# Altium footprint library RODION.PcbLib: 131 footprints (part 2 of 9)
Each footprint in its own frame and in the unit in brackets; x right, y up, seen from the top. Pads: shape width x height; smd on the part's side, far side on the other; paste and mask are expansions set on the pad; w line width, h text height; cw(c..) or ccw(c..) is an arc to the next point about the centre after c.
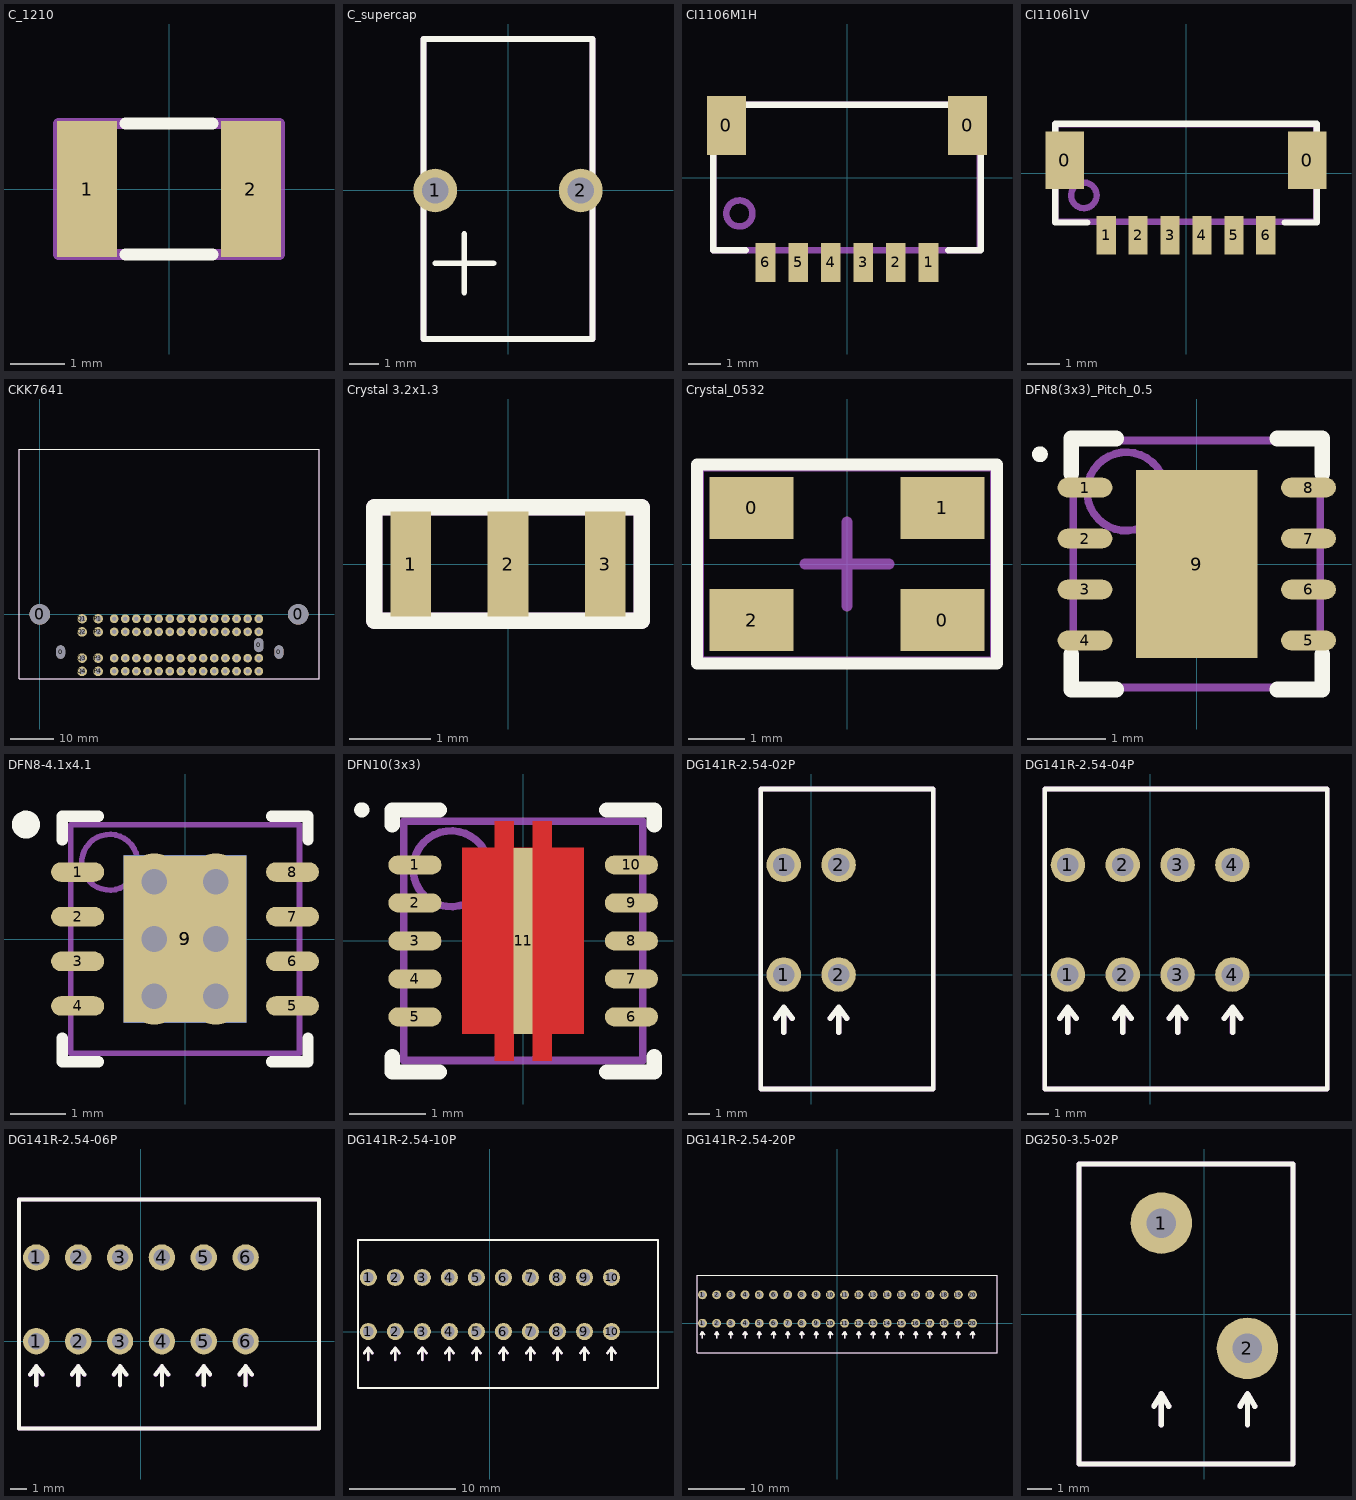
[diagram p1: the footprints below, top view; thin cyan lines are the x and y axes]

## C_1210 [mm] "Chip, Body 3.2x2.5mm, IPC High Density"
height 1.7
pads (2):
  rect 1.1x2.5 smd: 1(-1.5,0) 2(1.5,0)
Top Overlay:
  lines w0.22: -0.8,-1.2 0.8,-1.2 ; -0.8,1.2 0.8,1.2
Top_Assy:
  lines w0.2: -2.025,-1.2 2.025,-1.2 2.025,1.2 -2.025,1.2 -2.025,-1.2
  text ".Designator" at -1.35,-0.525 h1
3D body "CAP1210.stp": height 0.94, standoff 0, extent -1.6,-1.25 1.6,1.25

## C_supercap [mm]
height 11.5
pads (2):
  round 1.5 hole 0.9: 1(-2.5,0) 2(2.5,0)
Top Overlay:
  lines w0.2: -2.5,-2.5 -0.5,-2.5 ; -1.5,-3.5 -1.5,-1.5 ; -2.9,-5.1 2.9,-5.1 2.9,5.2 -2.9,5.2 -2.9,-5.1
Top_Assy:
  lines w0.2: -2.9,-5.1 -2.9,5.2 2.9,5.2 2.9,-5.1 -2.9,-5.1
  text ".Designator" at -1.375,-0.6 h1
3D body "Supercap.STEP": height 10.5, standoff -3, extent -2.75,-4.999 2.75,5

## CI1106M1H [mm] "CI1106M1H - 6 pin SMD connector, 1 mm pitch"
height 2.2
pads (8):
  rect 1.2x1.8 smd: 0(-3.7,1.6) 0(3.7,1.6)
  rect 0.6x1.2 smd: 1(2.5,-2.6) 2(1.5,-2.6) 3(0.5,-2.6) 4(-0.5,-2.6) 5(-1.5,-2.6) 6(-2.5,-2.6)
Top Overlay:
  lines w0.2: -3.1,-2.23 -4.1,-2.23 -4.1,2.23 4.1,2.23 4.1,-2.23 3.1,-2.23
Top_Assy:
  circle w0.2: c-3.3,-1.1 r0.4
  lines w0.2: -4.1,-2.23 -4.1,2.23 4.075,2.23 4.075,-2.23 -4.1,-2.23
  text ".Designator" at -3.5,0.6 h1
3D body "SM06B-SRSS-TB.step": height 2.9, standoff 0, extent -4,-2.8 4,2.15

## CI1106Ì1V [mm] "ÑI1106Ì1V - 6 pin SMD connector, 1 mm pitch"
height 4.25
pads (8):
  rect 1.2x1.8 smd: 0(-3.8,0.4) 0(3.8,0.4)
  rect 0.6x1.2 smd: 1(-2.5,-1.95) 2(-1.5,-1.95) 3(-0.5,-1.95) 4(0.5,-1.95) 5(1.5,-1.95) 6(2.5,-1.95)
Top Overlay:
  lines w0.2: -3.1,-1.55 -4.1,-1.55 -4.1,1.55 4.1,1.55 ; 3.1,-1.55 4.1,-1.55 4.1,1.55 ; 4,1.55 4.1,1.55
Top_Assy:
  circle w0.2: c-3.2,-0.7 r0.4
  lines w0.2: -4.1,-1.525 -4.1,1.525 4.075,1.525 4.075,-1.525 -4.1,-1.525
  text ".Designator" at -3.1,0.4 h1
3D body "ÑI1106Ì1V.STEP": height 4.25, standoff 0, extent -4,-2.2 4,1.4

## CKK7641 [mm] "CKK7641"
height 12
pads (69):
  round 4.7 hole 4.7 unplated: 0(0,0) 0(59,0)
  oval 2x3 hole 2 slot 3 at 90 deg unplated: 0(4.76,-8.6) 0(54.6,-8.6)
  oval 2x3.2 hole 2 slot 3.2 at 90 deg unplated: 0(50,-7)
  round 2 hole 1: A1(50,-1) A2(50,-4) A3(50,-10) A4(50,-13) B1(47.46,-1) B2(47.46,-4) B3(47.46,-10) B4(47.46,-13) C1(44.92,-1) C2(44.92,-4) C3(44.92,-10) C4(44.92,-13) D1(42.38,-1) D2(42.38,-4) D3(42.38,-10) D4(42.38,-13) E1(39.84,-1) E2(39.84,-4) E3(39.84,-10) E4(39.84,-13) F1(37.3,-1) F2(37.3,-4) F3(37.3,-10) F4(37.3,-13) G1(34.76,-1) G2(34.76,-4) G3(34.76,-10) G4(34.76,-13) H1(32.22,-1) H2(32.22,-4) H3(32.22,-10) H4(32.22,-13) J1(29.68,-1) J2(29.68,-4) J3(29.68,-10) J4(29.68,-13) K1(27.14,-1) K2(27.14,-4) K3(27.14,-10) K4(27.14,-13) L1(24.6,-1) L2(24.6,-4) L3(24.6,-10) L4(24.6,-13) M1(22.06,-1) M2(22.06,-4) M3(22.06,-10) M4(22.06,-13) N1(19.52,-1) N2(19.52,-4) N3(19.52,-10) N4(19.52,-13) O1(16.98,-1) O2(16.98,-4) O3(16.98,-10) O4(16.98,-13)
  round 2.2 hole 1.2: P1(13.33,-1) P2(13.33,-4) P3(13.33,-10) P4(13.33,-13) Q1(9.68,-1) Q2(9.68,-4) Q3(9.68,-10) Q4(9.68,-13)
Top Overlay:
  lines w0.2: -4.75,-14.75 -4.75,37.75 63.75,37.75 63.75,-14.75 -4.75,-14.75
Top_Assy:
  lines w0.22: -4.75,-14.75 -4.75,37.75 63.75,37.75 63.75,-14.75 -4.75,-14.75
  text ".Designator" at 25.75,-6.75 h1
Multi-Layer:
  pour cut-out: 0,-3.75 -0.246,-3.75 -0.734,-3.686 -1.208,-3.558 -1.663,-3.37 -2.088,-3.125 -2.478,-2.825 -2.826,-2.478 -3.125,-2.088 -3.371,-1.662 -3.559,-1.208 -3.686,-0.733 -3.75,-0.246 -3.75,0 -3.75,0.246 -3.686,0.733 -3.559,1.208 -3.371,1.662 -3.125,2.088 -2.826,2.478 -2.478,2.826 -2.088,3.125 -1.663,3.371 -1.208,3.559 -0.734,3.686 -0.246,3.75 0,3.75 0.245,3.75 0.733,3.686 1.208,3.559 1.662,3.371 2.087,3.125 2.477,2.826 2.825,2.478 3.124,2.088 3.37,1.662 3.558,1.208 3.685,0.733 3.75,0.246 3.75,0 3.75,-0.246 3.685,-0.733 3.558,-1.208 3.37,-1.662 3.124,-2.088 2.825,-2.478 2.477,-2.825 2.087,-3.125 1.662,-3.37 1.208,-3.558 0.733,-3.686 0.245,-3.75
  pour cut-out: 55.25,0 55.25,-0.246 55.314,-0.733 55.441,-1.208 55.629,-1.662 55.875,-2.088 56.174,-2.478 56.522,-2.825 56.912,-3.125 57.337,-3.37 57.792,-3.558 58.266,-3.686 58.754,-3.75 59,-3.75 59.245,-3.75 59.733,-3.686 60.208,-3.558 60.662,-3.37 61.087,-3.125 61.477,-2.825 61.825,-2.478 62.124,-2.088 62.37,-1.662 62.558,-1.208 62.685,-0.733 62.75,-0.246 62.75,0 62.75,0.246 62.685,0.733 62.558,1.208 62.37,1.662 62.124,2.088 61.825,2.478 61.477,2.826 61.087,3.125 60.662,3.371 60.208,3.559 59.733,3.686 59.245,3.75 59,3.75 58.754,3.75 58.266,3.686 57.792,3.559 57.337,3.371 56.912,3.125 56.522,2.826 56.174,2.478 55.875,2.088 55.629,1.662 55.441,1.208 55.314,0.733 55.25,0.246
3D body "CKK7641.stp": height 31.4, standoff -6, extent -4.25,-14 63.25,37.3

## Crystal 3.2x1.3 [mm] "Murata crystal built-in capacitors"
height 0.7
pads (3):
  rect 0.5x1.3 smd: 1(-1.2,0) 2(0,0) 3(1.2,0)
Top Overlay:
  lines w0.2: -1.65,-0.7 1.65,-0.7 1.65,0.7 -1.65,0.7 -1.65,-0.7
Top_Assy:
  lines w0.2: -1.65,-0.7 1.65,-0.7 1.65,0.7 -1.65,0.7 -1.65,-0.7
  text ".Designator" at -0.875,-0.5 h1
3D body "Crystal 3213.stp": height 0.7, standoff -0.01, extent -1.6,-0.67 1.6,0.67

## Crystal_0532 [mm]
height 1.5
pads (4):
  rect 1.5x1.1 smd: 0(-1.7,1) 0(1.7,-1) 1(1.7,1) 2(-1.7,-1)
Top Overlay:
  lines w0.22: -2.675,-1.775 2.675,-1.775 2.675,1.775 -2.675,1.775 -2.675,-1.775
Top_Assy:
  lines w0.2: -0.75,0 0,0 ; 0,-0.75 0,0 ; 0,0.75 0,0 ; 0.75,0 0,0 ; -2.65,-1.75 2.65,-1.75 2.65,1.75 -2.65,1.75 -2.65,-1.75
3D body "CRYSTALSMD5X32.STEP": height 1, standoff 0, extent -2.5,-1.6 2.5,1.6

## DFN8(3x3)_Pitch_0.5 [mm] "SON, 8-Leads, Body 3x3mm, Pitch 0.5mm, Thermal Pad 2.38x1.64mm, IPC High Density"
height 1
pads (9):
  oval 0.7x0.25 smd: 1(-1.425,0.975) 2(-1.425,0.325) 3(-1.425,-0.325) 4(-1.425,-0.975) 5(1.425,-0.975) 6(1.425,-0.325) 7(1.425,0.325) 8(1.425,0.975)
  rect 1.55x2.4 smd paste-0.82: 9(0,0)
Top Overlay:
  circle w0.1: c-2,1.4 r0.05
  lines w0.2: -1.6,-1.15 -1.6,-1.6 -1.025,-1.6 ; -1.6,1.15 -1.6,1.6 -1.025,1.6 ; 1.025,-1.6 1.6,-1.6 1.6,-1.15 ; 1.025,1.6 1.6,1.6 1.6,1.15
Top Paste:
  rectangle: -0.725,0.1 0.725,0.525
  rectangle: -0.725,0.725 0.725,1.15
  rectangle: -0.725,-0.525 0.725,-0.1
  rectangle: -0.725,-1.15 0.725,-0.725
Top_Assy:
  circle w0.1: c-0.9,0.925 r0.5
  lines w0.1: -1.575,-1.575 -1.575,1.575 1.575,1.575 1.575,-1.575 -1.575,-1.575
  text ".Designator" at -1,-0.575 h1
3D body "DFN-8.STEP": height 0.8, standoff 0, extent -1.51,-1.5 1.51,1.5

## DFN8-4.1x4.1 [mm] "SON, 8-Leads, Body 4x4mm, Pitch 0.8mm, Thermal Pad 3x2.2mm, TI Recommended"
height 0.8
pads (10):
  oval 0.95x0.35 smd paste-0.025 mask+0.07: 1(-1.925,1.2) 2(-1.925,0.4) 3(-1.925,-0.4) 4(-1.925,-1.2) 5(1.925,-1.2) 6(1.925,-0.4) 7(1.925,0.4) 8(1.925,1.2)
  rect 2.2x3 smd paste-1.1 mask+0.07: 9(0,0)
  rect 2.2x3 smd far side paste-1.1 mask+0.07: 9(0,0)
via -0.55,1.025 diameter 1.016 hole 0.457
via 0.55,-1.025 diameter 1.016 hole 0.457
via -0.55,-1.025 diameter 1.016 hole 0.457
via 0.55,0 diameter 1.016 hole 0.457
via -0.55,0 diameter 1.016 hole 0.457
via 0.55,1.025 diameter 1.016 hole 0.457
Top Overlay:
  circle w0.25: c-2.85,2.05 r0.125
  lines w0.2: -2.2,-1.775 -2.2,-2.2 -1.55,-2.2 ; -2.2,1.775 -2.2,2.2 -1.55,2.2 ; 1.55,-2.2 2.2,-2.2 2.2,-1.775 ; 1.55,2.2 2.2,2.2 2.2,1.775
Top Paste:
  rectangle: -1.05,0.15 -0.15,1.45
  region: 1.05,1.45 0.15,1.45 0.15,0.15 1.05,0.15
  region: 1.05,-0.15 0.15,-0.15 0.15,-1.45 1.05,-1.45
  rectangle: -1.05,-1.45 -0.15,-0.15
Top_Assy:
  circle w0.1: c-1.35,1.375 r0.5
  lines w0.1: -2.05,-2.05 -2.05,2.05 2.05,2.05 2.05,-2.05 -2.05,-2.05
  text ".Designator" at -1.4,-0.25 h1
3D body "DFN8 Body 4x4 Pitch 0_8mm.STEP": height 0.95, standoff -0.05, extent -2.05,-2 2.05,2

## DFN10(3x3) [mm] "SON, 10-Leads, Body 3x3mm, Pitch 0.5mm, Thermal Pad 2.45x1.6mm, IPC High Density"
height 1
pads (11):
  oval 0.7x0.25 smd: 1(-1.425,1) 2(-1.425,0.5) 3(-1.425,0) 4(-1.425,-0.5) 5(-1.425,-1) 6(1.425,-1) 7(1.425,-0.5) 8(1.425,0) 9(1.425,0.5) 10(1.425,1)
  rect 0.25x2.45 smd paste+0 mask+0: 11(0,0)
Top Layer:
  region: -0.8,-1.225 -0.375,-1.225 -0.375,-1.575 -0.125,-1.575 -0.125,-1.225 0.125,-1.225 0.125,-1.575 0.375,-1.575 0.375,-1.225 0.8,-1.225 0.8,1.225 0.375,1.225 0.375,1.575 0.125,1.575 0.125,1.225 -0.125,1.225 -0.125,1.575 -0.375,1.575 -0.375,1.225 -0.8,1.225
Top Overlay:
  circle w0.1: c-2.125,1.725 r0.05
  lines w0.2: -1.725,-1.525 -1.725,-1.725 -1.1,-1.725 ; -1.725,1.525 -1.725,1.725 -1.1,1.725 ; 1.1,-1.725 1.725,-1.725 1.725,-1.525 ; 1.1,1.725 1.725,1.725 1.725,1.525
Top_Assy:
  circle w0.1: c-0.95,0.95 r0.5
  lines w0.1: -1.575,-1.575 -1.575,1.575 1.575,1.575 1.575,-1.575 -1.575,-1.575
  text ".Designator" at -1.325,-1.125 h1
3D body "DFN-10.STEP": height 0.8, standoff 0, extent -1.5,-1.5 1.5,1.5

## DG141R-2.54-02P [mm] "DG141R-2.54-02P Connector, 1.7x8.43 offset"
height 12.6
pads (4):
  round 1.6 hole 1: 1(-1.27,0) 1(-1.27,5.08) 2(1.27,0) 2(1.27,5.08)
Top Overlay:
  lines w0.22: -2.34,-5.3 -2.34,8.6 5.66,8.6 5.66,-5.3 -2.34,-5.3
  lines w0.254: -1.646,-2.025 -1.265,-1.517 ; -1.265,-2.66 -1.265,-1.517 ; -0.884,-2.025 -1.265,-1.517 ; 0.894,-2.025 1.275,-1.517 ; 1.275,-2.66 1.275,-1.517 ; 1.656,-2.025 1.275,-1.517
Top_Assy:
  lines w0.22: -2.34,-5.3 5.66,-5.3 5.66,8.6 -2.34,8.6 -2.34,-5.3
  lines w0.254: -1.651,-2.032 -1.27,-1.524 ; -1.27,-2.667 -1.27,-1.524 ; -0.889,-2.032 -1.27,-1.524 ; 0.889,-2.032 1.27,-1.524 ; 1.27,-2.667 1.27,-1.524 ; 1.651,-2.032 1.27,-1.524
  text ".Designator" at -1.27,1.524 h1
3D body "DG141R-02.stp": height 12.62, standoff -3.47, extent -2.11,-5.17 5.51,8.43

## DG141R-2.54-04P [mm] "DG141R-2.54-04P Connector, 1.7x8.43 offset"
height 12.6
pads (8):
  round 1.6 hole 1: 1(-3.81,0) 1(-3.81,5.08) 2(-1.27,0) 2(-1.27,5.08) 3(1.27,0) 3(1.27,5.08) 4(3.81,0) 4(3.81,5.08)
Top Overlay:
  lines w0.22: -4.88,-5.3 8.2,-5.3 8.2,8.6 -4.88,8.6 -4.88,-5.3
  lines w0.254: -4.191,-2.025 -3.81,-1.517 ; -3.81,-2.66 -3.81,-1.517 ; -3.429,-2.025 -3.81,-1.517 ; -1.646,-2.025 -1.265,-1.517 ; -1.265,-2.66 -1.265,-1.517 ; -0.884,-2.025 -1.265,-1.517 ; 0.894,-2.025 1.275,-1.517 ; 1.275,-2.66 1.275,-1.517 ; 1.656,-2.025 1.275,-1.517 ; 3.434,-2.025 3.815,-1.517 ; 3.815,-2.66 3.815,-1.517 ; 4.196,-2.025 3.815,-1.517
Top_Assy:
  lines w0.22: -4.88,-5.3 -4.88,8.6 8.2,8.6 8.2,-5.3 -4.88,-5.3
  lines w0.254: -4.191,-2.032 -3.81,-1.524 ; -3.81,-2.667 -3.81,-1.524 ; -3.429,-2.032 -3.81,-1.524 ; -1.651,-2.032 -1.27,-1.524 ; -1.27,-2.667 -1.27,-1.524 ; -0.889,-2.032 -1.27,-1.524 ; 0.889,-2.032 1.27,-1.524 ; 1.27,-2.667 1.27,-1.524 ; 1.651,-2.032 1.27,-1.524 ; 3.429,-2.032 3.81,-1.524 ; 3.81,-2.667 3.81,-1.524 ; 4.191,-2.032 3.81,-1.524
  text ".Designator" at -2.975,1.525 h1
3D body "DG141R-04.stp": height 12.59, standoff -3.5, extent -4.65,-5.17 8.05,8.43

## DG141R-2.54-06P [mm] "DG141R-2.54-06P Connector"
height 12.6
pads (12):
  round 1.6 hole 1: 1(-6.35,0) 1(-6.35,5.08) 2(-3.81,0) 2(-3.81,5.08) 3(-1.27,0) 3(-1.27,5.08) 4(1.27,0) 4(1.27,5.08) 5(3.81,0) 5(3.81,5.08) 6(6.35,0) 6(6.35,5.08)
Top Overlay:
  lines w0.22: -7.4,-5.3 -7.4,8.6 10.8,8.6 10.8,-5.3 -7.4,-5.3
  lines w0.254: -6.731,-2.025 -6.35,-1.517 ; -6.35,-2.66 -6.35,-1.517 ; -5.969,-2.025 -6.35,-1.517 ; -4.191,-2.025 -3.81,-1.517 ; -3.81,-2.66 -3.81,-1.517 ; -3.429,-2.025 -3.81,-1.517 ; -1.646,-2.025 -1.265,-1.517 ; -1.265,-2.66 -1.265,-1.517 ; -0.884,-2.025 -1.265,-1.517 ; 0.894,-2.025 1.275,-1.517 ; 1.275,-2.66 1.275,-1.517 ; 1.656,-2.025 1.275,-1.517 ; 3.429,-2.025 3.81,-1.517 ; 3.81,-2.66 3.81,-1.517 ; 4.191,-2.025 3.81,-1.517 ; 5.969,-2.025 6.35,-1.517 ; 6.35,-2.66 6.35,-1.517 ; 6.731,-2.025 6.35,-1.517
Top_Assy:
  lines w0.22: -7.4,-5.3 -7.4,8.6 10.8,8.6 10.8,-5.3 -7.4,-5.3
  lines w0.254: -6.726,-2.032 -6.345,-1.524 ; -6.345,-2.667 -6.345,-1.524 ; -5.964,-2.032 -6.345,-1.524 ; -4.191,-2.032 -3.81,-1.524 ; -3.81,-2.667 -3.81,-1.524 ; -3.429,-2.032 -3.81,-1.524 ; -1.651,-2.032 -1.27,-1.524 ; -1.27,-2.667 -1.27,-1.524 ; -0.889,-2.032 -1.27,-1.524 ; 0.889,-2.032 1.27,-1.524 ; 1.27,-2.667 1.27,-1.524 ; 1.651,-2.032 1.27,-1.524 ; 3.434,-2.032 3.815,-1.524 ; 3.815,-2.667 3.815,-1.524 ; 4.196,-2.032 3.815,-1.524 ; 5.974,-2.032 6.355,-1.524 ; 6.355,-2.667 6.355,-1.524 ; 6.736,-2.032 6.355,-1.524
3D body "DG141R-06.stp": height 12.59, standoff -3.5, extent -7.19,-5.17 10.59,8.43

## DG141R-2.54-10P [mm] "DG141R-2.54-10P Connector"
height 12.6
pads (20):
  round 1.6 hole 1: 1(-11.43,0) 1(-11.43,5.08) 2(-8.89,0) 2(-8.89,5.08) 3(-6.35,0) 3(-6.35,5.08) 4(-3.81,0) 4(-3.81,5.08) 5(-1.27,0) 5(-1.27,5.08) 6(1.27,0) 6(1.27,5.08) 7(3.81,0) 7(3.81,5.08) 8(6.35,0) 8(6.35,5.08) 9(8.89,0) 9(8.89,5.08) 10(11.43,0) 10(11.43,5.08)
Top Overlay:
  lines w0.22: -12.4,-5.3 -12.4,8.6 15.8,8.6 15.8,-5.3 -12.4,-5.3
  lines w0.254: -11.811,-2.025 -11.43,-1.517 ; -11.43,-2.66 -11.43,-1.517 ; -11.049,-2.025 -11.43,-1.517 ; -9.271,-2.025 -8.89,-1.517 ; -8.89,-2.66 -8.89,-1.517 ; -8.509,-2.025 -8.89,-1.517 ; -6.731,-2.025 -6.35,-1.517 ; -6.35,-2.66 -6.35,-1.517 ; -5.969,-2.025 -6.35,-1.517 ; -4.191,-2.025 -3.81,-1.517 ; -3.81,-2.66 -3.81,-1.517 ; -3.429,-2.025 -3.81,-1.517 ; -1.646,-2.025 -1.265,-1.517 ; -1.265,-2.66 -1.265,-1.517 ; -0.884,-2.025 -1.265,-1.517 ; 0.894,-2.025 1.275,-1.517 ; 1.275,-2.66 1.275,-1.517 ; 1.656,-2.025 1.275,-1.517 ; 3.429,-2.025 3.81,-1.517 ; 3.81,-2.66 3.81,-1.517 ; 4.191,-2.025 3.81,-1.517 ; 5.969,-2.025 6.35,-1.517 ; 6.35,-2.66 6.35,-1.517 ; 6.731,-2.025 6.35,-1.517 ; 8.509,-2.025 8.89,-1.517 ; 8.89,-2.66 8.89,-1.517 ; 9.271,-2.025 8.89,-1.517 ; 11.049,-2.025 11.43,-1.517 ; 11.43,-2.66 11.43,-1.517 ; 11.811,-2.025 11.43,-1.517
Top_Assy:
  lines w0.22: -12.4,-5.3 -12.4,8.6 15.8,8.6 15.8,-5.3 -12.4,-5.3
  lines w0.254: -11.806,-2.032 -11.425,-1.524 ; -11.425,-2.667 -11.425,-1.524 ; -11.044,-2.032 -11.425,-1.524 ; -9.266,-2.032 -8.885,-1.524 ; -8.885,-2.667 -8.885,-1.524 ; -8.504,-2.032 -8.885,-1.524 ; -6.726,-2.032 -6.345,-1.524 ; -6.345,-2.667 -6.345,-1.524 ; -5.964,-2.032 -6.345,-1.524 ; -4.191,-2.032 -3.81,-1.524 ; -3.81,-2.667 -3.81,-1.524 ; -3.429,-2.032 -3.81,-1.524 ; -1.651,-2.032 -1.27,-1.524 ; -1.27,-2.667 -1.27,-1.524 ; -0.889,-2.032 -1.27,-1.524 ; 0.889,-2.032 1.27,-1.524 ; 1.27,-2.667 1.27,-1.524 ; 1.651,-2.032 1.27,-1.524 ; 3.434,-2.032 3.815,-1.524 ; 3.815,-2.667 3.815,-1.524 ; 4.196,-2.032 3.815,-1.524 ; 5.974,-2.032 6.355,-1.524 ; 6.355,-2.667 6.355,-1.524 ; 6.736,-2.032 6.355,-1.524 ; 8.509,-2.025 8.89,-1.517 ; 8.89,-2.66 8.89,-1.517 ; 9.271,-2.025 8.89,-1.517 ; 11.049,-2.025 11.43,-1.517 ; 11.43,-2.66 11.43,-1.517 ; 11.811,-2.025 11.43,-1.517
  text ".Designator" at -5.075,2.6 h1
3D body "10.stp": height 12.59, standoff -3.5, extent -12.27,-5.17 15.67,8.43

## DG141R-2.54-20P [mm] "DG141R Connector; 20 Position"
height 12.6
pads (40):
  round 1.6 hole 1: 1(-24.13,0) 1(-24.13,5.08) 2(-21.59,0) 2(-21.59,5.08) 3(-19.05,0) 3(-19.05,5.08) 4(-16.51,0) 4(-16.51,5.08) 5(-13.97,0) 5(-13.97,5.08) 6(-11.43,0) 6(-11.43,5.08) 7(-8.89,0) 7(-8.89,5.08) 8(-6.35,0) 8(-6.35,5.08) 9(-3.81,0) 9(-3.81,5.08) 10(-1.27,0) 10(-1.27,5.08) 11(1.27,0) 11(1.27,5.08) 12(3.81,0) 12(3.81,5.08) 13(6.35,0) 13(6.35,5.08) 14(8.89,0) 14(8.89,5.08) 15(11.43,0) 15(11.43,5.08) 16(13.97,0) 16(13.97,5.08) 17(16.51,0) 17(16.51,5.08) 18(19.05,0) 18(19.05,5.08) 19(21.59,0) 19(21.59,5.08) 20(24.13,0) 20(24.13,5.08)
Top Overlay:
  lines w0.22: -25.1,-5.3 28.5,-5.3 28.5,8.6 -25.1,8.6 -25.1,-5.3
  lines w0.254: -24.511,-2.025 -24.13,-1.517 ; -24.13,-2.66 -24.13,-1.517 ; -23.749,-2.025 -24.13,-1.517 ; -21.971,-2.025 -21.59,-1.517 ; -21.59,-2.66 -21.59,-1.517 ; -21.209,-2.025 -21.59,-1.517 ; -19.431,-2.025 -19.05,-1.517 ; -19.05,-2.66 -19.05,-1.517 ; -18.669,-2.025 -19.05,-1.517 ; -16.891,-2.025 -16.51,-1.517 ; -16.51,-2.66 -16.51,-1.517 ; -16.129,-2.025 -16.51,-1.517 ; -14.351,-2.025 -13.97,-1.517 ; -13.97,-2.66 -13.97,-1.517 ; -13.589,-2.025 -13.97,-1.517 ; -11.811,-2.025 -11.43,-1.517 ; -11.43,-2.66 -11.43,-1.517 ; -11.049,-2.025 -11.43,-1.517 ; -9.271,-2.025 -8.89,-1.517 ; -8.89,-2.66 -8.89,-1.517 ; -8.509,-2.025 -8.89,-1.517 ; -6.731,-2.025 -6.35,-1.517 ; -6.35,-2.66 -6.35,-1.517 ; -5.969,-2.025 -6.35,-1.517 ; -4.191,-2.025 -3.81,-1.517 ; -3.81,-2.66 -3.81,-1.517 ; -3.429,-2.025 -3.81,-1.517 ; -1.646,-2.025 -1.265,-1.517 ; -1.265,-2.66 -1.265,-1.517 ; -0.884,-2.025 -1.265,-1.517 ; 0.894,-2.025 1.275,-1.517 ; 1.275,-2.66 1.275,-1.517 ; 1.656,-2.025 1.275,-1.517 ; 3.429,-2.025 3.81,-1.517 ; 3.81,-2.66 3.81,-1.517 ; 4.191,-2.025 3.81,-1.517 ; 5.969,-2.025 6.35,-1.517 ; 6.35,-2.66 6.35,-1.517 ; 6.731,-2.025 6.35,-1.517 ; 8.509,-2.025 8.89,-1.517 ; 8.89,-2.66 8.89,-1.517 ; 9.271,-2.025 8.89,-1.517 ; 11.049,-2.025 11.43,-1.517 ; 11.43,-2.66 11.43,-1.517 ; 11.811,-2.025 11.43,-1.517 ; 13.589,-2.025 13.97,-1.517 ; 13.97,-2.66 13.97,-1.517 ; 14.351,-2.025 13.97,-1.517 ; 16.129,-2.025 16.51,-1.517 ; 16.51,-2.66 16.51,-1.517 ; 16.891,-2.025 16.51,-1.517 ; 18.669,-2.025 19.05,-1.517 ; 19.05,-2.66 19.05,-1.517 ; 19.431,-2.025 19.05,-1.517 ; 21.209,-2.025 21.59,-1.517 ; 21.59,-2.66 21.59,-1.517 ; 21.971,-2.025 21.59,-1.517 ; 23.749,-2.025 24.13,-1.517 ; 24.13,-2.66 24.13,-1.517 ; 24.511,-2.025 24.13,-1.517
Top_Assy:
  lines w0.22: -25.1,-5.3 -25.1,8.6 28.5,8.6 28.5,-5.3 -25.1,-5.3
  lines w0.254: -24.506,-2.032 -24.125,-1.524 ; -24.125,-2.667 -24.125,-1.524 ; -23.744,-2.032 -24.125,-1.524 ; -21.966,-2.032 -21.585,-1.524 ; -21.585,-2.667 -21.585,-1.524 ; -21.204,-2.032 -21.585,-1.524 ; -19.431,-2.025 -19.05,-1.517 ; -19.05,-2.66 -19.05,-1.517 ; -18.669,-2.025 -19.05,-1.517 ; -16.891,-2.025 -16.51,-1.517 ; -16.51,-2.66 -16.51,-1.517 ; -16.129,-2.025 -16.51,-1.517 ; -14.346,-2.032 -13.965,-1.524 ; -13.965,-2.667 -13.965,-1.524 ; -13.584,-2.032 -13.965,-1.524 ; -11.806,-2.032 -11.425,-1.524 ; -11.425,-2.667 -11.425,-1.524 ; -11.044,-2.032 -11.425,-1.524 ; -9.266,-2.032 -8.885,-1.524 ; -8.885,-2.667 -8.885,-1.524 ; -8.504,-2.032 -8.885,-1.524 ; -6.726,-2.032 -6.345,-1.524 ; -6.345,-2.667 -6.345,-1.524 ; -5.964,-2.032 -6.345,-1.524 ; -4.191,-2.032 -3.81,-1.524 ; -3.81,-2.667 -3.81,-1.524 ; -3.429,-2.032 -3.81,-1.524 ; -1.651,-2.032 -1.27,-1.524 ; -1.27,-2.667 -1.27,-1.524 ; -0.889,-2.032 -1.27,-1.524 ; 0.889,-2.032 1.27,-1.524 ; 1.27,-2.667 1.27,-1.524 ; 1.651,-2.032 1.27,-1.524 ; 3.434,-2.032 3.815,-1.524 ; 3.815,-2.667 3.815,-1.524 ; 4.196,-2.032 3.815,-1.524 ; 5.974,-2.032 6.355,-1.524 ; 6.355,-2.667 6.355,-1.524 ; 6.736,-2.032 6.355,-1.524 ; 8.509,-2.025 8.89,-1.517 ; 8.89,-2.66 8.89,-1.517 ; 9.271,-2.025 8.89,-1.517 ; 11.049,-2.025 11.43,-1.517 ; 11.43,-2.66 11.43,-1.517 ; 11.811,-2.025 11.43,-1.517 ; 13.594,-2.032 13.975,-1.524 ; 13.975,-2.667 13.975,-1.524 ; 14.356,-2.032 13.975,-1.524 ; 16.134,-2.032 16.515,-1.524 ; 16.515,-2.667 16.515,-1.524 ; 16.896,-2.032 16.515,-1.524 ; 18.674,-2.032 19.055,-1.524 ; 19.055,-2.667 19.055,-1.524 ; 19.436,-2.032 19.055,-1.524 ; 21.214,-2.032 21.595,-1.524 ; 21.595,-2.667 21.595,-1.524 ; 21.976,-2.032 21.595,-1.524 ; 23.749,-2.032 24.13,-1.524 ; 24.13,-2.667 24.13,-1.524 ; 24.511,-2.032 24.13,-1.524
  text ".Designator" at -9.85,4.35 h1
3D body "20.stp": height 12.59, standoff -3.5, extent -24.97,-5.17 28.37,8.43

## DG250-3.5-02P [mm] "DG250-5.0-2p Connector"
height 12
pads (2):
  round 2.5 hole 1.2: 1(-1.75,3.7) 2(1.75,-1.4)
Top Overlay:
  lines w0.2: -5.1,-6.1 3.6,-6.1 3.6,6.1 -5.1,6.1 -5.1,-6.1
  lines w0.22: -2.05,-3.75 -1.75,-3.25 ; -1.75,-4.5 -1.75,-3.25 ; -1.45,-3.75 -1.75,-3.25 ; 1.45,-3.75 1.75,-3.25 ; 1.75,-4.5 1.75,-3.25 ; 2.05,-3.75 1.75,-3.25
Top_Assy:
  lines w0.22: -2.05,-3.75 -1.75,-3.25 ; -1.75,-4.5 -1.75,-3.25 ; -1.45,-3.75 -1.75,-3.25 ; 1.45,-3.75 1.75,-3.25 ; 1.75,-4.5 1.75,-3.25 ; 2.05,-3.75 1.75,-3.25 ; -5.1,-6.1 3.6,-6.1 3.6,6.1 -5.1,6.1 -5.1,-6.1
  text ".Designator" at -2.775,-0.2 h1
3D body "DG250-3.5-2.stp": height 13.05, standoff -3.25, extent -5,-6 3.5,6